# Altium footprint library pw.PcbLib: 210 footprints (part 3 of 14)
Each footprint in its own frame and in the unit in brackets; x right, y up, seen from the top. Pads: shape width x height; smd on the part's side, far side on the other; paste and mask are expansions set on the pad; w line width, h text height; cw(c..) or ccw(c..) is an arc to the next point about the centre after c.
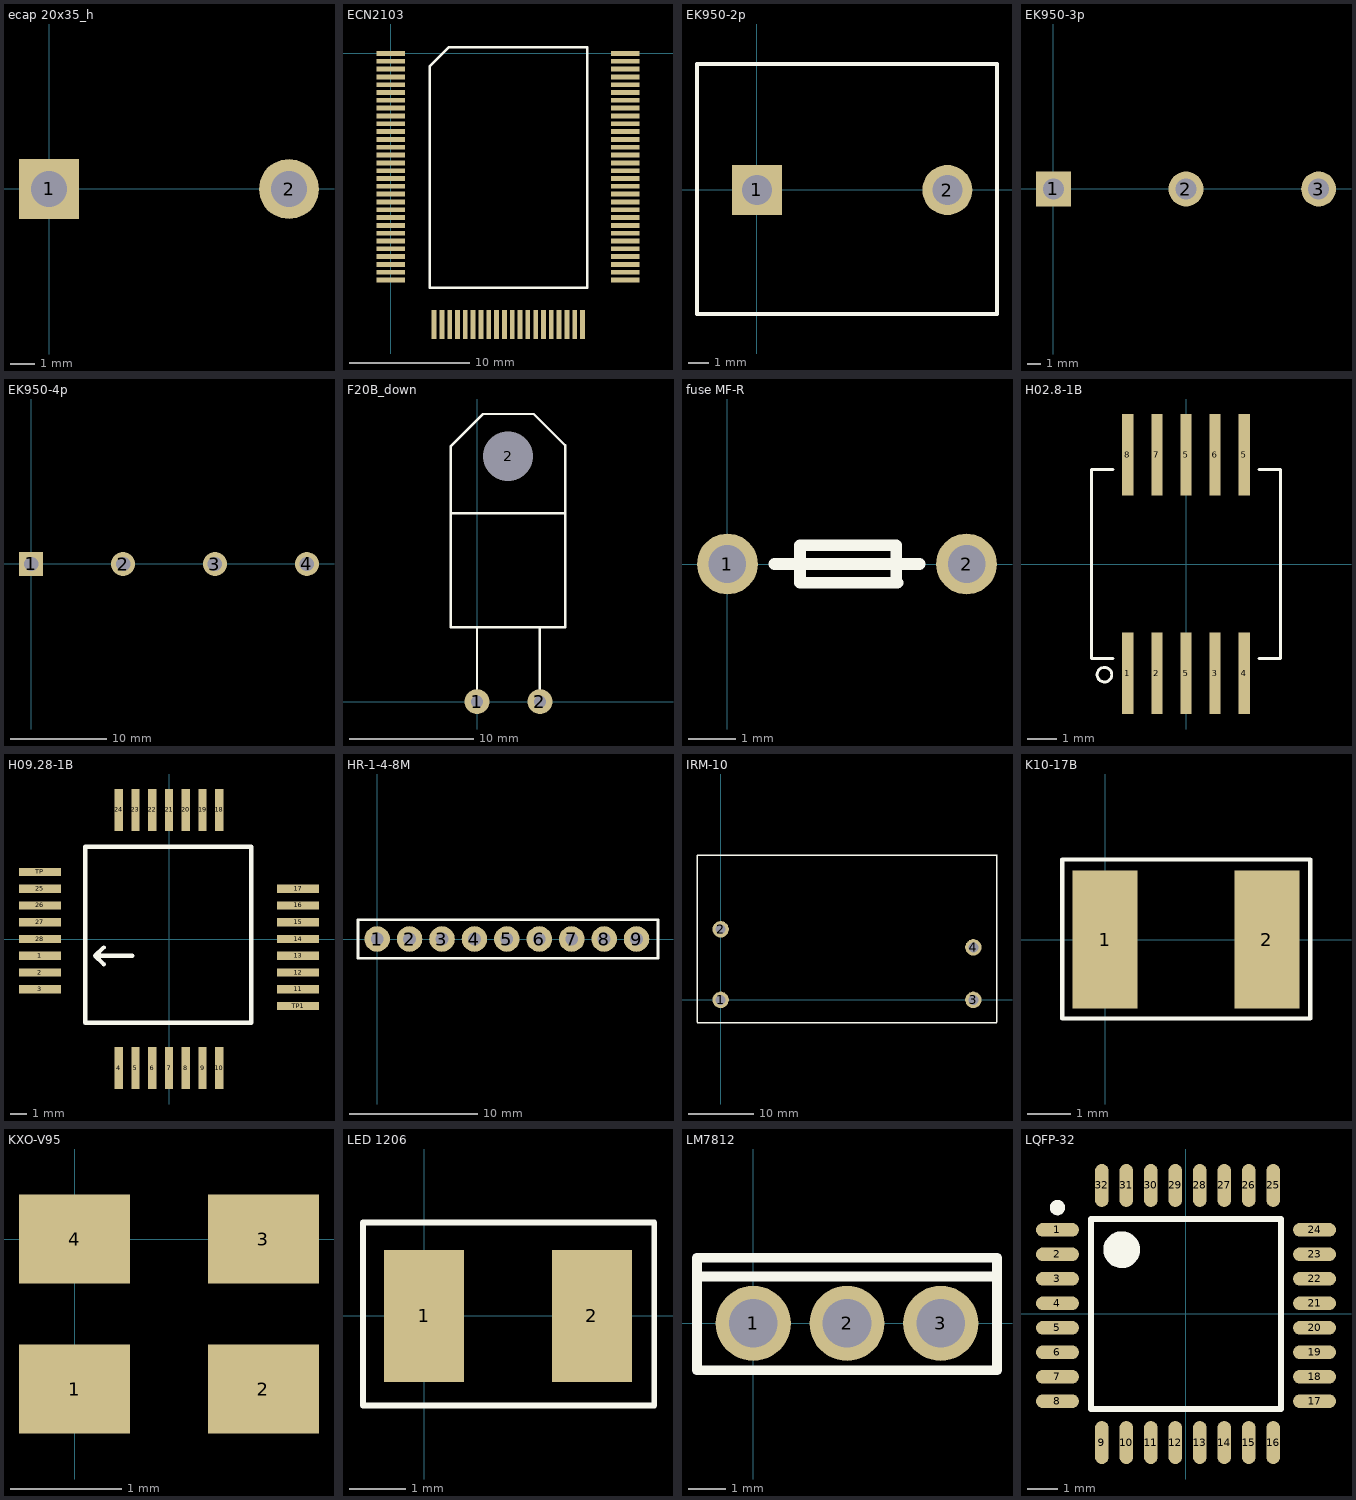
[diagram p2: the footprints below, top view; thin cyan lines are the x and y axes]

## ecap 20x35_h [mm]
pads (2):
  rect 2.5x2.5 hole 1.5: 1(0,0)
  round 2.5 hole 1.5: 2(10,0)
3D body "User Library-Cap electrolitic radial 20x35.STEP": height 20, standoff 0, extent -4.996,-39.8 14.996,-3.3

## ECN2103 [mm]
pads (80):
  rect 2.4x0.4 smd: 1(0,0) 2(0,-0.65) 3(0,-1.3) 4(0,-1.95) 5(0,-2.6) 6(0,-3.25) 7(0,-3.9) 8(0,-4.55) 9(0,-5.2) 10(0,-5.85) 11(0,-6.5) 12(0,-7.15) 13(0,-7.8) 14(0,-8.45) 15(0,-9.1) 16(0,-9.75) 17(0,-10.4) 18(0,-11.05) 19(0,-11.7) 20(0,-12.35) 21(0,-13) 22(0,-13.65) 23(0,-14.3) 24(0,-14.95) 25(0,-15.6) 26(0,-16.25) 27(0,-16.9) 28(0,-17.55) 29(0,-18.2) 30(0,-18.85) 51(19.5,-18.85) 52(19.5,-18.2) 53(19.5,-17.55) 54(19.5,-16.9) 55(19.5,-16.25) 56(19.5,-15.6) 57(19.5,-14.95) 58(19.5,-14.3) 59(19.5,-13.65) 60(19.5,-13) 61(19.5,-12.35) 62(19.5,-11.7) 63(19.5,-11.05) 64(19.5,-10.4) 65(19.5,-9.75) 66(19.5,-9.1) 67(19.5,-8.45) 68(19.5,-7.8) 69(19.5,-7.15) 70(19.5,-6.5) 71(19.5,-5.85) 72(19.5,-5.2) 73(19.5,-4.55) 74(19.5,-3.9) 75(19.5,-3.25) 76(19.5,-2.6) 77(19.5,-1.95) 78(19.5,-1.3) 79(19.5,-0.65) 80(19.5,0)
  rect 0.4x2.4 smd: 31(3.6,-22.55) 32(4.25,-22.55) 33(4.9,-22.55) 34(5.55,-22.55) 35(6.2,-22.55) 36(6.85,-22.55) 37(7.5,-22.55) 38(8.15,-22.55) 39(8.8,-22.55) 40(9.45,-22.55) 41(10.1,-22.55) 42(10.75,-22.55) 43(11.4,-22.55) 44(12.05,-22.55) 45(12.7,-22.55) 46(13.35,-22.55) 47(14,-22.55) 48(14.65,-22.55) 49(15.3,-22.55) 50(15.95,-22.55)
Top Overlay:
  lines w0.2: 3.25,-19.5 16.35,-19.5 16.35,0.5 4.8,0.5 3.25,-1.05 3.25,-19.5

## EK950-2p [mm]
pads (2):
  rect 2.5x2.5 hole 1.5: 1(0,0)
  round 2.5 hole 1.5: 2(9.52,0)
Top Overlay:
  lines w0.2: -3,-6.2 -3,6.3 12,6.3 12,-6.2 -3,-6.2

## EK950-3p [mm]
pads (3):
  rect 2.5x2.5 hole 1.5: 1(0,0)
  round 2.5 hole 1.5: 2(9.52,0) 3(19.04,0)
3D body "37751.stp": height 21.5, standoff -5, extent -4.765,-4.5 24.365,8

## EK950-4p [mm]
pads (4):
  rect 2.5x2.5 hole 1.5: 1(0,0)
  round 2.5 hole 1.5: 2(9.52,0) 3(19.04,0) 4(28.56,0)
3D body "37751.stp": height 21.5, standoff -5, extent 4.67,-4.5 33.8,8
3D body "37751.stp": height 21.5, standoff -5, extent -4.7,-4.5 24.43,8

## F20B_down [mm] "thermostat"
pads (3):
  round 2 hole 1: 1(0,0) 2(5.08,0)
  round 1.524 hole 4: 2(2.502,19.798)
Top Overlay:
  lines w0.2: 0,0 0,6 ; 5.08,0 5.08,6 ; -2.1,15.2 -2.1,20.617 0.483,23.2 4.579,23.2 7.1,20.679 7.1,15.2 ; -2.1,15.2 -2.1,6 7.1,6 7.1,15.2 ; -2.1,15.2 7.1,15.2
3D body "User Library-cantherm f1107515za0060NO WIRES.STEP": height 5.41, standoff -4.63, extent -2.095,0 7.1,23.291

## fuse MF-R [mm] "самовосстанавливающийся предохранитель"
pads (2):
  round 1.3 hole 0.8: 1(0,0) 2(5.1,0)
Top Overlay:
  lines w0.254: 1,0 4.1,0 ; 1.55,-0.4 1.55,0.4 3.6,0.4 3.6,-0.4 ; 1.575,-0.4 3.625,-0.4
3D body "User Library-MF-R090.STEP": height 17.05, standoff -2.65, extent -3.2,-1.55 8.5,1.55

## H02.8-1B [mm]
pads (10):
  rect 0.38x2.8 smd: 1(-2,-3.75) 2(-1,-3.75) 3(1,-3.75) 4(2,-3.75) 5(0,-3.75) 5(0,3.75) 5(2,3.75) 6(1,3.75) 7(-1,3.75) 8(-2,3.75)
Top Overlay:
  circle w0.1: c-2.8,-3.8 r0.25
  lines w0.1: -2.5,-3.25 -2.844,-3.25 -3.25,-3.25 -3.25,3.25 -2.844,3.25 -2.5,3.25 ; 2.5,-3.25 2.844,-3.25 3.25,-3.25 3.25,3.25 2.844,3.25 2.5,3.25
3D body "User Library-H02_8-1B1.step": height 3.05, standoff 0, extent -3.25,-4.75 3.25,4.75

## H09.28-1B [mm]
pads (30):
  rect 2.5x0.5 smd: 1(-7.7,-1) 2(-7.7,-2) 3(-7.7,-3) 11(7.7,-3) 12(7.7,-2) 13(7.7,-1) 14(7.7,0) 15(7.7,1) 16(7.7,2) 17(7.7,3) 25(-7.7,3) 26(-7.7,2) 27(-7.7,1) 28(-7.7,0) TP(-7.7,4) TP1(7.7,-4)
  rect 0.5x2.5 smd: 4(-3,-7.7) 5(-2,-7.7) 6(-1,-7.7) 7(0,-7.7) 8(1,-7.7) 9(2,-7.7) 10(3,-7.7) 18(3,7.7) 19(2,7.7) 20(1,7.7) 21(0,7.7) 22(-1,7.7) 23(-2,7.7) 24(-3,7.7)
Top Overlay:
  lines w0.254: -3.9,-1.5 -4.4,-1 ; -3.9,-0.5 -4.4,-1 ; -2.2,-1 -4.4,-1 ; -5,-5 4.9,-5 4.9,5.5 4,5.5 -5,5.5 -5,-5
3D body "User Library-N09_28-1V.STEP": height 3, standoff 0, extent -8.84,-8.84 8.84,8.84

## HR-1-4-8M [mm] "резисторная сборка"
pads (9):
  round 2 hole 1: 1(0,0) 2(2.54,0) 3(5.08,0) 4(7.62,0) 5(10.16,0) 6(12.7,0) 7(15.24,0) 8(17.78,0) 9(20.32,0)
Top Overlay:
  lines w0.2: -1.5,-1.5 22,-1.5 22,1.5 -1.5,1.5 -1.5,-1.5
3D body "68086.stp": height 4.95, standoff -3.43, extent -1.21,-1.245 21.6,1.245

## IRM-10 [mm] "AC/DC MW"
pads (4):
  round 2.5 hole 1.5: 1(0,0) 2(0,10.75) 3(38.5,0) 4(38.5,8)
Top Overlay:
  lines w0.2: -3.6,-3.45 42.1,-3.45 ; -3.6,-3.4 -3.6,22 42.1,22 42.1,-3.4
3D body "User Library-IRM-10-12.STEP": height 22.05, standoff -3.5, extent -3.55,-3.4 42.15,22

## K10-17B [mm]
pads (2):
  rect 1.5x3.2 smd: 1(0,0) 2(3.751,0)
Top Overlay:
  lines w0.1: -0.989,-1.83 4.753,-1.83 4.753,0.764 4.753,1.855 -0.989,1.855 -0.989,-1.83
3D body: height 1.5, standoff 0, extent -0.131,-1.496 3.869,1.504
3D body: height 1.51, standoff 0, extent 3.411,-1.509 3.911,1.51
3D body: height 1.51, standoff 0, extent -0.176,-1.499 0.324,1.51

## KXO-V95 [mm] "Clock Oscillator Geyer"
pads (4):
  rect 1x0.8 smd: 1(0,-1.35) 2(1.7,-1.35) 3(1.7,0) 4(0,0)
3D body "User Library-KXO-V95.STEP": height 0.82, standoff 0, extent -0.4,-1.68 2.101,0.321

## LED 1206 [mil]
pads (2):
  rect 56x92 smd: 1(0,0) 2(117,0)
Top Overlay:
  lines w3.94: -42.5,-62.5 -42.5,65 160.5,65 160.5,-11 160.5,-62.5 -42.5,-62.5
3D body "User Library-LED 1206 BLUE.STEP": height 43.31, standoff 0, extent -3.94,-31.5 122.05,31.5

## LM7812 [mm]
pads (3):
  round 2 hole 1.3: 1(0,0) 2(2.5,0) 3(5,0)
Top Overlay:
  lines w0.254: -1.5,1.25 -1.5,-0.375 -1.5,-1.25 6.5,-1.25 6.5,1.25 ; -1.5,1.25 6.5,1.25 ; -1.5,1.25 -1.5,1.75 6.5,1.75 6.5,1.25
3D body "SW3DPS-TO-220HS-DEFAULT.STEP": height 18.54, standoff -3.81, extent -2.54,-1.397 7.62,3.175

## LQFP-32 [mm]
pads (32):
  oval 1.4x0.45 smd: 1(-4.2,2.75) 2(-4.2,1.95) 3(-4.2,1.15) 4(-4.2,0.35) 5(-4.2,-0.45) 6(-4.2,-1.25) 7(-4.2,-2.05) 8(-4.2,-2.85) 17(4.2,-2.85) 18(4.2,-2.05) 19(4.2,-1.25) 20(4.2,-0.45) 21(4.2,0.35) 22(4.2,1.15) 23(4.2,1.95) 24(4.2,2.75)
  oval 0.45x1.4 smd: 9(-2.75,-4.2) 10(-1.95,-4.2) 11(-1.15,-4.2) 12(-0.35,-4.2) 13(0.45,-4.2) 14(1.25,-4.2) 15(2.05,-4.2) 16(2.85,-4.2) 25(2.85,4.2) 26(2.05,4.2) 27(1.25,4.2) 28(0.45,4.2) 29(-0.35,4.2) 30(-1.15,4.2) 31(-1.95,4.2) 32(-2.75,4.2)
Top Overlay:
  circle w0.25: c-4.2,3.475 r0.125
  circle w0.6: c-2.1,2.1 r0.3
  lines w0.2: -3.1,-3.1 -3.1,3.1 3.1,3.1 3.1,-3.1 -3.1,-3.1
3D body "User Library-LQFP32.STEP": height 1.63, standoff -0.09, extent -4.45,-4.55 4.55,4.45